# Altium schematic symbol library Capacitor - Ceramic - Sumsung.SchLib: 1421 symbols (part 2 of 8) (continued)
## CL10A225KA8NNNC (continued)
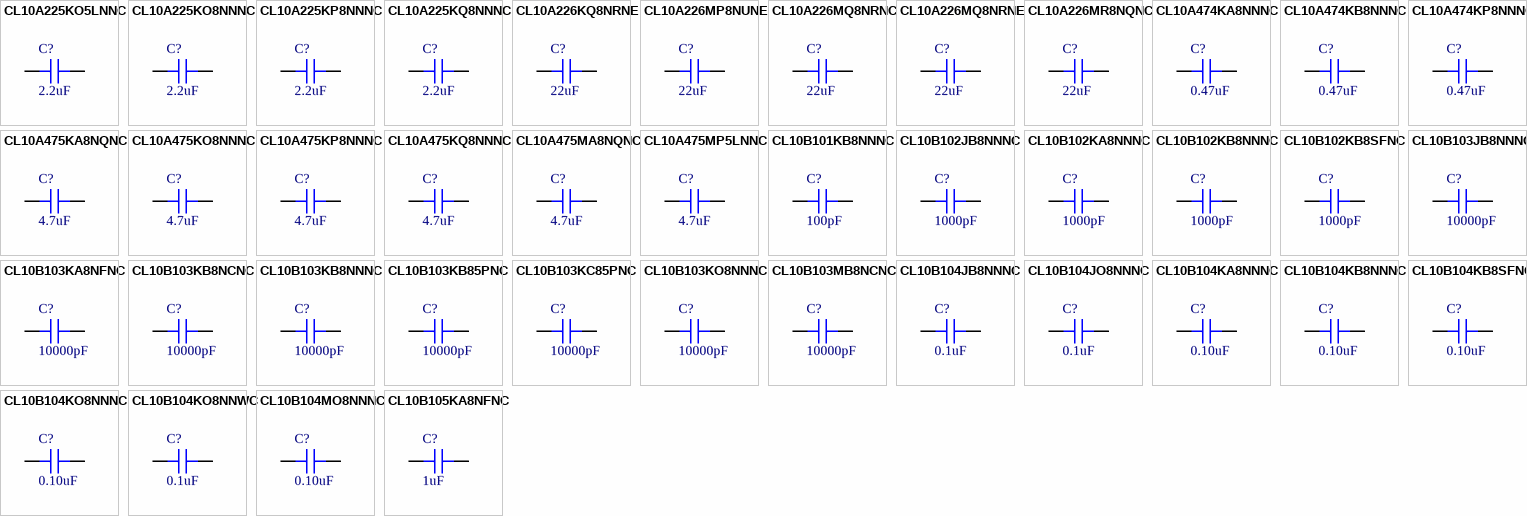
[diagram p7: symbols CL10A225KO5LNNC to CL10B105KA8NFNC]

## CL10A225KO5LNNC
designator C?, comment 2.2uF
CAP CER 2.2UF 16V X5R 0603; Part Number: CL10A225KO5LNNC; Manufacturer: Samsung Electro-Mechanics; TemperatureRange: -55C ~ 85C; Tolerance: 10%; Value: 2.2uF; PartId: 30554; Supplier 1: Digi-Key; Supplier Part Number 1: 1276-1880-2-ND; ComponentLink1Description: Datasheet; ComponentLink1URL: http://www.samsungsem.com/kr/support/product-search/mlcc/CL10A225KO5LNNC.jsp; ComponentLink2Description: Digi-Key Listing; ComponentLink2URL: https://www.digikey.com/product-detail/en/samsung-electro-mechanics/CL10A225KO5LNNC/1276-1880-2-ND/3887538; TemperatureCoefficient: X5R; Voltage: 16V; Price: 0; Device Package: 0603 (1608 Metric)
footprint CAP 0603/1608
pins: 1, 2

## CL10A225KO8NNNC
designator C?, comment 2.2uF
CAP CER 2.2UF 16V X5R 0603; Part Number: CL10A225KO8NNNC; Manufacturer: Samsung Electro-Mechanics America, Inc.; TemperatureRange: -55C ~ 85C; Tolerance: 10%; Value: 2.2uF; PartId: 13108; Supplier 1: Digi-Key; Supplier Part Number 1: 1276-1040-2-ND; ComponentLink1Description: Datasheet; ComponentLink1URL: http://www.samsungsem.com/kr/support/product-search/mlcc/CL10A225KO8NNNC.jsp; ComponentLink2Description: Digi-Key Listing; ComponentLink2URL: https://www.digikey.com/product-detail/en/samsung-electro-mechanics-america-inc/CL10A225KO8NNNC/1276-1040-2-ND/3886698; TemperatureCoefficient: X5R; Voltage: 16V; Price: 0.0236; Device Package: 0603 (1608 Metric)
footprint CAP 0603/1608
pins: 1, 2

## CL10A225KP8NNNC
designator C?, comment 2.2uF
CAP CER 2.2UF 10V X5R 0603; Part Number: CL10A225KP8NNNC; Manufacturer: Samsung Electro-Mechanics America, Inc.; TemperatureRange: -55C ~ 85C; Tolerance: 10%; Value: 2.2uF; PartId: 13147; Supplier 1: Digi-Key; Supplier Part Number 1: 1276-1085-2-ND; ComponentLink1Description: Datasheet; ComponentLink1URL: http://www.samsungsem.com/kr/support/product-search/mlcc/CL10A225KP8NNNC.jsp; ComponentLink2Description: Digi-Key Listing; ComponentLink2URL: https://www.digikey.com/product-detail/en/samsung-electro-mechanics-america-inc/CL10A225KP8NNNC/1276-1085-2-ND/3886743; TemperatureCoefficient: X5R; Voltage: 10V; Price: 0.0184; Device Package: 0603 (1608 Metric)
footprint CAP 0603/1608
pins: 1, 2

## CL10A225KQ8NNNC
designator C?, comment 2.2uF
CAP CER 2.2UF 6.3V X5R 0603; Part Number: CL10A225KQ8NNNC; Manufacturer: Samsung Electro-Mechanics America, Inc.; TemperatureRange: -55C ~ 85C; Tolerance: 10%; Value: 2.2uF; PartId: 13344; Supplier 1: Digi-Key; Supplier Part Number 1: 1276-1183-2-ND; ComponentLink1Description: Datasheet; ComponentLink1URL: http://www.samsungsem.com/kr/support/product-search/mlcc/CL10A225KQ8NNNC.jsp; ComponentLink2Description: Digi-Key Listing; ComponentLink2URL: https://www.digikey.com/product-detail/en/samsung-electro-mechanics-america-inc/CL10A225KQ8NNNC/1276-1183-2-ND/3886841; TemperatureCoefficient: X5R; Voltage: 6.3V; Price: 0.0166; Device Package: 0603 (1608 Metric)
footprint CAP 0603/1608
pins: 1, 2

## CL10A226KQ8NRNE
designator C?, comment 22uF
CAP CER 22UF 6.3V X5R 0603; Part Number: CL10A226KQ8NRNE; Manufacturer: Samsung Electro-Mechanics America, Inc.; TemperatureRange: -55C ~ 85C; Tolerance: 10%; Value: 22uF; PartId: 13568; Supplier 1: Digi-Key; Supplier Part Number 1: 1276-2867-2-ND; ComponentLink1Description: Datasheet; ComponentLink1URL: //media.digikey.com/pdf/Data%20Sheets/Samsung%20PDFs/CL10A226KQ8NRNE_Spec.pdf; ComponentLink2Description: Digi-Key Listing; ComponentLink2URL: https://www.digikey.com/product-detail/en/samsung-electro-mechanics-america-inc/CL10A226KQ8NRNE/1276-2867-2-ND/3888525; TemperatureCoefficient: X5R; Voltage: 6.3V; Price: 0.0741; Device Package: 0603 (1608 Metric)
footprint CAP 0603/1608
pins: 1, 2

## CL10A226MP8NUNE
designator C?, comment 22uF
CAP CER 22UF 10V X5R 0603; Part Number: CL10A226MP8NUNE; Manufacturer: Samsung Electro-Mechanics America, Inc.; TemperatureRange: -55C ~ 85C; Tolerance: 20%; Value: 22uF; PartId: 13111; Supplier 1: Digi-Key; Supplier Part Number 1: 1276-1274-2-ND; ComponentLink1Description: Datasheet; ComponentLink1URL: http://www.samsungsem.com/kr/support/product-search/mlcc/CL10A226MP8NUNE.jsp; ComponentLink2Description: Digi-Key Listing; ComponentLink2URL: https://www.digikey.com/product-detail/en/samsung-electro-mechanics-america-inc/CL10A226MP8NUNE/1276-1274-2-ND/3886932; TemperatureCoefficient: X5R; Voltage: 10V; Price: 0.112; Device Package: 0603 (1608 Metric)
footprint CAP 0603/1608
pins: 1, 2

## CL10A226MQ8NRNC
designator C?, comment 22uF
CAP CER 22UF 6.3V X5R 0603; Part Number: CL10A226MQ8NRNC; Manufacturer: Samsung Electro-Mechanics America, Inc.; TemperatureRange: -55C ~ 85C; Tolerance: 20%; Value: 22uF; PartId: 13020; Supplier 1: Digi-Key; Supplier Part Number 1: 1276-1193-2-ND; ComponentLink1Description: Datasheet; ComponentLink1URL: http://www.samsungsem.com/kr/support/product-search/mlcc/CL10A226MQ8NRNC.jsp; ComponentLink2Description: Digi-Key Listing; ComponentLink2URL: https://www.digikey.com/product-detail/en/samsung-electro-mechanics-america-inc/CL10A226MQ8NRNC/1276-1193-2-ND/3886851; TemperatureCoefficient: X5R; Voltage: 6.3V; Price: 0.0473; Device Package: 0603 (1608 Metric)
footprint CAP 0603/1608
pins: 1, 2

## CL10A226MQ8NRNE
designator C?, comment 22uF
CAP CER 22UF 6.3V X5R 0603; Part Number: CL10A226MQ8NRNE; Manufacturer: Samsung Electro-Mechanics America, Inc.; TemperatureRange: -55C ~ 85C; Tolerance: 20%; Value: 22uF; PartId: 13063; Supplier 1: Digi-Key; Supplier Part Number 1: 1276-2868-2-ND; ComponentLink1Description: Datasheet; ComponentLink1URL: http://www.samsungsem.com/kr/support/product-search/mlcc/CL10A226MQ8NRNE.jsp; ComponentLink2Description: Digi-Key Listing; ComponentLink2URL: https://www.digikey.com/product-detail/en/samsung-electro-mechanics-america-inc/CL10A226MQ8NRNE/1276-2868-2-ND/3888526; TemperatureCoefficient: X5R; Voltage: 6.3V; Price: 0.0512; Device Package: 0603 (1608 Metric)
footprint CAP 0603/1608
pins: 1, 2

## CL10A226MR8NQNC
designator C?, comment 22uF
CAP CER 22UF 4V X5R 0603; Part Number: CL10A226MR8NQNC; Manufacturer: Samsung Electro-Mechanics America, Inc.; TemperatureRange: -55C ~ 85C; Tolerance: 20%; Value: 22uF; PartId: 13385; Supplier 1: Digi-Key; Supplier Part Number 1: 1276-1891-2-ND; ComponentLink1Description: Datasheet; ComponentLink1URL: //media.digikey.com/pdf/Data%20Sheets/Samsung%20PDFs/CL10A226MR8NQNC_spec.pdf; ComponentLink2Description: Digi-Key Listing; ComponentLink2URL: https://www.digikey.com/product-detail/en/samsung-electro-mechanics-america-inc/CL10A226MR8NQNC/1276-1891-2-ND/3887549; TemperatureCoefficient: X5R; Voltage: 4V; Price: 0.0647; Device Package: 0603 (1608 Metric)
footprint CAP 0603/1608
pins: 1, 2

## CL10A474KA8NNNC
designator C?, comment 0.47uF
CAP CER 0.47UF 25V X5R 0603; Part Number: CL10A474KA8NNNC; Manufacturer: Samsung Electro-Mechanics; TemperatureRange: -55C ~ 85C; Tolerance: 10%; Value: 0.47uF; PartId: 30457; Supplier 1: Digi-Key; Supplier Part Number 1: 1276-1895-2-ND; ComponentLink1Description: Datasheet; ComponentLink1URL: http://www.samsungsem.com/kr/support/product-search/mlcc/CL10A474KA8NNNC.jsp; ComponentLink2Description: Digi-Key Listing; ComponentLink2URL: https://www.digikey.com/product-detail/en/samsung-electro-mechanics/CL10A474KA8NNNC/1276-1895-2-ND/3887553; TemperatureCoefficient: X5R; Voltage: 25V; Price: 0; Device Package: 0603 (1608 Metric)
footprint CAP 0603/1608
pins: 1, 2

## CL10A474KB8NNNC
designator C?, comment 0.47uF
CAP CER 0.47UF 50V X5R 0603; Part Number: CL10A474KB8NNNC; Manufacturer: Samsung Electro-Mechanics America, Inc.; TemperatureRange: -55C ~ 85C; Tolerance: 10%; Value: 0.47uF; PartId: 13543; Supplier 1: Digi-Key; Supplier Part Number 1: 1276-1896-2-ND; ComponentLink1Description: Datasheet; ComponentLink1URL: http://www.samsungsem.com/kr/support/product-search/mlcc/CL10A474KB8NNNC.jsp; ComponentLink2Description: Digi-Key Listing; ComponentLink2URL: https://www.digikey.com/product-detail/en/samsung-electro-mechanics-america-inc/CL10A474KB8NNNC/1276-1896-2-ND/3887554; TemperatureCoefficient: X5R; Voltage: 50V; Price: 0.0281; Device Package: 0603 (1608 Metric)
footprint CAP 0603/1608
pins: 1, 2

## CL10A474KP8NNNC
designator C?, comment 0.47uF
CAP CER 0.47UF 10V X5R 0603; Part Number: CL10A474KP8NNNC; Manufacturer: Samsung Electro-Mechanics; TemperatureRange: -55C ~ 85C; Tolerance: 10%; Value: 0.47uF; PartId: 30344; Supplier 1: Digi-Key; Supplier Part Number 1: 1276-1898-2-ND; ComponentLink1Description: Datasheet; ComponentLink1URL: http://www.samsungsem.com/kr/support/product-search/mlcc/CL10A474KP8NNNC.jsp; ComponentLink2Description: Digi-Key Listing; ComponentLink2URL: https://www.digikey.com/product-detail/en/samsung-electro-mechanics/CL10A474KP8NNNC/1276-1898-2-ND/3887556; TemperatureCoefficient: X5R; Voltage: 10V; Price: 0; Device Package: 0603 (1608 Metric)
footprint CAP 0603/1608
pins: 1, 2

## CL10A475KA8NQNC
designator C?, comment 4.7uF
CAP CER 4.7UF 25V X5R 0603; Part Number: CL10A475KA8NQNC; Manufacturer: Samsung Electro-Mechanics America, Inc.; TemperatureRange: -55C ~ 85C; Tolerance: 10%; Value: 4.7uF; PartId: 13123; Supplier 1: Digi-Key; Supplier Part Number 1: 1276-1900-2-ND; ComponentLink1Description: Datasheet; ComponentLink1URL: http://www.samsungsem.com/kr/support/product-search/mlcc/CL10A475KA8NQNC.jsp; ComponentLink2Description: Digi-Key Listing; ComponentLink2URL: https://www.digikey.com/product-detail/en/samsung-electro-mechanics-america-inc/CL10A475KA8NQNC/1276-1900-2-ND/3887558; TemperatureCoefficient: X5R; Voltage: 25V; Price: 0.0763; Device Package: 0603 (1608 Metric)
footprint CAP 0603/1608
pins: 1, 2

## CL10A475KO8NNNC
designator C?, comment 4.7uF
CAP CER 4.7UF 16V X5R 0603; Part Number: CL10A475KO8NNNC; Manufacturer: Samsung Electro-Mechanics America, Inc.; TemperatureRange: -55C ~ 85C; Tolerance: 10%; Value: 4.7uF; PartId: 13180; Supplier 1: Digi-Key; Supplier Part Number 1: 1276-1784-2-ND; ComponentLink1Description: Datasheet; ComponentLink1URL: http://www.samsungsem.com/kr/support/product-search/mlcc/CL10A475KO8NNNC.jsp; ComponentLink2Description: Digi-Key Listing; ComponentLink2URL: https://www.digikey.com/product-detail/en/samsung-electro-mechanics-america-inc/CL10A475KO8NNNC/1276-1784-2-ND/3887442; TemperatureCoefficient: X5R; Voltage: 16V; Price: 0.0499; Device Package: 0603 (1608 Metric)
footprint CAP 0603/1608
pins: 1, 2

## CL10A475KP8NNNC
designator C?, comment 4.7uF
CAP CER 4.7UF 10V X5R 0603; Part Number: CL10A475KP8NNNC; Manufacturer: Samsung Electro-Mechanics America, Inc.; TemperatureRange: -55C ~ 85C; Tolerance: 10%; Value: 4.7uF; PartId: 13341; Supplier 1: Digi-Key; Supplier Part Number 1: 1276-1044-2-ND; ComponentLink1Description: Datasheet; ComponentLink1URL: http://www.samsungsem.com/kr/support/product-search/mlcc/CL10A475KP8NNNC.jsp; ComponentLink2Description: Digi-Key Listing; ComponentLink2URL: https://www.digikey.com/product-detail/en/samsung-electro-mechanics-america-inc/CL10A475KP8NNNC/1276-1044-2-ND/3886702; TemperatureCoefficient: X5R; Voltage: 10V; Price: 0.0205; Device Package: 0603 (1608 Metric)
footprint CAP 0603/1608
pins: 1, 2

## CL10A475KQ8NNNC
designator C?, comment 4.7uF
CAP CER 4.7UF 6.3V X5R 0603; Part Number: CL10A475KQ8NNNC; Manufacturer: Samsung Electro-Mechanics America, Inc.; TemperatureRange: -55C ~ 85C; Tolerance: 10%; Value: 4.7uF; PartId: 13295; Supplier 1: Digi-Key; Supplier Part Number 1: 1276-1045-2-ND; ComponentLink1Description: Datasheet; ComponentLink1URL: http://www.samsungsem.com/kr/support/product-search/mlcc/CL10A475KQ8NNNC.jsp; ComponentLink2Description: Digi-Key Listing; ComponentLink2URL: https://www.digikey.com/product-detail/en/samsung-electro-mechanics-america-inc/CL10A475KQ8NNNC/1276-1045-2-ND/3886703; TemperatureCoefficient: X5R; Voltage: 6.3V; Price: 0.0144; Device Package: 0603 (1608 Metric)
footprint CAP 0603/1608
pins: 1, 2

## CL10A475MA8NQNC
designator C?, comment 4.7uF
CAP CER 4.7UF 25V X5R 0603; Part Number: CL10A475MA8NQNC; Manufacturer: Samsung Electro-Mechanics America, Inc.; TemperatureRange: -55C ~ 85C; Tolerance: 20%; Value: 4.7uF; PartId: 13584; Supplier 1: Digi-Key; Supplier Part Number 1: 1276-1903-2-ND; ComponentLink1Description: Datasheet; ComponentLink1URL: http://www.samsungsem.com/kr/front/downloadcms.do?path=/kr/support/product-search/mlcc/__icsFiles/afieldfile/2014/11/05&fileName=C_CL10A475MA8NQNC.pdf; ComponentLink2Description: Digi-Key Listing; ComponentLink2URL: https://www.digikey.com/product-detail/en/samsung-electro-mechanics-america-inc/CL10A475MA8NQNC/1276-1903-2-ND/3887561; TemperatureCoefficient: X5R; Voltage: 25V; Price: 0.0763; Device Package: 0603 (1608 Metric)
footprint CAP 0603/1608
pins: 1, 2

## CL10A475MP5LNNC
designator C?, comment 4.7uF
CAP CER 4.7UF 10V X5R 0603; Part Number: CL10A475MP5LNNC; Manufacturer: Samsung Electro-Mechanics; TemperatureRange: -55C ~ 85C; Tolerance: 20%; Value: 4.7uF; PartId: 30543; Supplier 1: Digi-Key; Supplier Part Number 1: 1276-6684-2-ND; ComponentLink1Description: Datasheet; ComponentLink1URL: http://www.samsungsem.com/kr/support/product-search/mlcc/CL10A475MP5LNNC.jsp; ComponentLink2Description: Digi-Key Listing; ComponentLink2URL: https://www.digikey.com/product-detail/en/samsung-electro-mechanics/CL10A475MP5LNNC/1276-6684-2-ND/5961168; TemperatureCoefficient: X5R; Voltage: 10V; Price: 0; Device Package: 0603 (1608 Metric)
footprint CAP 0603/1608
pins: 1, 2

## CL10B101KB8NNNC
designator C?, comment 100pF
CAP CER 100PF 50V X7R 0603; Part Number: CL10B101KB8NNNC; Manufacturer: Samsung Electro-Mechanics America, Inc.; TemperatureRange: -55C ~ 125C; Tolerance: 10%; Value: 100pF; PartId: 5325; Supplier 1: Digi-Key; Supplier Part Number 1: 1276-1909-2-ND; ComponentLink1Description: Datasheet; ComponentLink1URL: http://www.samsungsem.com/kr/support/product-search/mlcc/CL10B101KB8NNNC.jsp; ComponentLink2Description: Digi-Key listing; ComponentLink2URL: http://digikey.com/product-detail/en/CL10B101KB8NNNC/1276-1909-2-ND/3887567; TemperatureCoefficient: X7R; Voltage: 50V; Price: 0.0086; Type: -; Device Package: 0603 (1608 Metric)
footprint CAP 0603/1608
pins: 1, 2

## CL10B102JB8NNNC
designator C?, comment 1000pF
CAP CER 1000PF 50V X7R 0603; Part Number: CL10B102JB8NNNC; Manufacturer: Samsung Electro-Mechanics America, Inc.; TemperatureRange: -55C ~ 125C; Tolerance: 5%; Value: 1000pF; PartId: 5384; Supplier 1: Digi-Key; Supplier Part Number 1: 1276-1194-2-ND; ComponentLink1Description: Datasheet; ComponentLink1URL: http://www.samsungsem.com/kr/support/product-search/mlcc/CL10B102JB8NNNC.jsp; ComponentLink2Description: Digi-Key listing; ComponentLink2URL: http://digikey.com/product-detail/en/CL10B102JB8NNNC/1276-1194-2-ND/3886852; TemperatureCoefficient: X7R; Voltage: 50V; Price: 0.0106; Type: -; Device Package: 0603 (1608 Metric)
footprint CAP 0603/1608
pins: 1, 2

## CL10B102KA8NNNC
designator C?, comment 1000pF
CAP CER 1000PF 25V X7R 0603; Part Number: CL10B102KA8NNNC; Manufacturer: Samsung Electro-Mechanics America, Inc.; TemperatureRange: -55C ~ 125C; Tolerance: 10%; Value: 1000pF; PartId: 5270; Supplier 1: Digi-Key; Supplier Part Number 1: 1276-1195-2-ND; ComponentLink1Description: Datasheet; ComponentLink1URL: http://www.samsungsem.com/kr/support/product-search/mlcc/CL10B102KA8NNNC.jsp; ComponentLink2Description: Digi-Key listing; ComponentLink2URL: http://digikey.com/product-detail/en/CL10B102KA8NNNC/1276-1195-2-ND/3886853; TemperatureCoefficient: X7R; Voltage: 25V; Price: 0.0046; Type: -; Device Package: 0603 (1608 Metric)
footprint CAP 0603/1608
pins: 1, 2

## CL10B102KB8NNNC
designator C?, comment 1000pF
CAP CER 1000PF 50V X7R 0603; Part Number: CL10B102KB8NNNC; Manufacturer: Samsung Electro-Mechanics America, Inc.; TemperatureRange: -55C ~ 125C; Tolerance: 10%; Value: 1000pF; PartId: 5269; Supplier 1: Digi-Key; Supplier Part Number 1: 1276-1018-2-ND; ComponentLink1Description: Datasheet; ComponentLink1URL: http://www.samsungsem.com/kr/support/product-search/mlcc/CL10B102KB8NNNC.jsp; ComponentLink2Description: Digi-Key listing; ComponentLink2URL: http://digikey.com/product-detail/en/CL10B102KB8NNNC/1276-1018-2-ND/3886676; TemperatureCoefficient: X7R; Voltage: 50V; Price: 0.0046; Type: -; Device Package: 0603 (1608 Metric)
footprint CAP 0603/1608
pins: 1, 2

## CL10B102KB8SFNC
designator C?, comment 1000pF
CAP CER 1000PF 50V X7R 0603; Part Number: CL10B102KB8SFNC; Manufacturer: Samsung Electro-Mechanics America, Inc.; TemperatureRange: -55C ~ 125C; Tolerance: 10%; Value: 1000pF; PartId: 13009; Supplier 1: Digi-Key; Supplier Part Number 1: 1276-1916-2-ND; ComponentLink1Description: Datasheet; ComponentLink1URL: http://www.samsungsem.com/kr/support/product-search/mlcc/CL10B102KB8SFNC.jsp; ComponentLink2Description: Digi-Key Listing; ComponentLink2URL: https://www.digikey.com/product-detail/en/samsung-electro-mechanics-america-inc/CL10B102KB8SFNC/1276-1916-2-ND/3887574; TemperatureCoefficient: X7R; Voltage: 50V; Price: 0.0032; Device Package: 0603 (1608 Metric)
footprint CAP 0603/1608
pins: 1, 2

## CL10B103JB8NNNC
designator C?, comment 10000pF
CAP CER 10000PF 50V X7R 0603; Part Number: CL10B103JB8NNNC; Manufacturer: Samsung Electro-Mechanics America, Inc.; TemperatureRange: -55C ~ 125C; Tolerance: 5%; Value: 10000pF; PartId: 13288; Supplier 1: Digi-Key; Supplier Part Number 1: 1276-1103-2-ND; ComponentLink1Description: Datasheet; ComponentLink1URL: http://www.samsungsem.com/kr/support/product-search/mlcc/CL10B103JB8NNNC.jsp; ComponentLink2Description: Digi-Key Listing; ComponentLink2URL: https://www.digikey.com/product-detail/en/samsung-electro-mechanics-america-inc/CL10B103JB8NNNC/1276-1103-2-ND/3886761; TemperatureCoefficient: X7R; Voltage: 50V; Price: 0.0069; Device Package: 0603 (1608 Metric)
footprint CAP 0603/1608
pins: 1, 2

## CL10B103KA8NFNC
designator C?, comment 10000pF
CAP CER 10000PF 25V X7R 0603; Part Number: CL10B103KA8NFNC; Manufacturer: Samsung Electro-Mechanics; TemperatureRange: -55C ~ 125C; Tolerance: 10%; Value: 10000pF; PartId: 30233; Supplier 1: Digi-Key; Supplier Part Number 1: 1276-1919-2-ND; ComponentLink1Description: Datasheet; ComponentLink1URL: http://www.samsungsem.com/kr/support/product-search/mlcc/CL10B103KA8NFNC.jsp; ComponentLink2Description: Digi-Key Listing; ComponentLink2URL: https://www.digikey.com/product-detail/en/samsung-electro-mechanics/CL10B103KA8NFNC/1276-1919-2-ND/3887577; TemperatureCoefficient: X7R; Voltage: 25V; Price: 0; Device Package: 0603 (1608 Metric)
footprint CAP 0603/1608
pins: 1, 2

## CL10B103KB8NCNC
designator C?, comment 10000pF
CAP CER 10000PF 50V X7R 0603; Part Number: CL10B103KB8NCNC; Manufacturer: Samsung Electro-Mechanics America, Inc.; TemperatureRange: -55C ~ 125C; Tolerance: 10%; Value: 10000pF; PartId: 13008; Supplier 1: Digi-Key; Supplier Part Number 1: 1276-1921-2-ND; ComponentLink1Description: Datasheet; ComponentLink1URL: http://www.samsungsem.com/kr/support/library/product-catalog/__icsFiles/afieldfile/2015/11/18/MLCC.pdf; ComponentLink2Description: Digi-Key Listing; ComponentLink2URL: https://www.digikey.com/product-detail/en/samsung-electro-mechanics-america-inc/CL10B103KB8NCNC/1276-1921-2-ND/3887579; TemperatureCoefficient: X7R; Voltage: 50V; Price: 0.0032; Device Package: 0603 (1608 Metric)
footprint CAP 0603/1608
pins: 1, 2

## CL10B103KB8NNNC
designator C?, comment 10000pF
CAP CER 10000PF 50V X7R 0603; Part Number: CL10B103KB8NNNC; Manufacturer: Samsung Electro-Mechanics America, Inc.; TemperatureRange: -55C ~ 125C; Tolerance: 10%; Value: 10000pF; PartId: 13141; Supplier 1: Digi-Key; Supplier Part Number 1: 1276-1009-2-ND; ComponentLink1Description: Datasheet; ComponentLink1URL: http://www.samsungsem.com/kr/support/product-search/mlcc/CL10B103KB8NNNC.jsp; ComponentLink2Description: Digi-Key Listing; ComponentLink2URL: https://www.digikey.com/product-detail/en/samsung-electro-mechanics-america-inc/CL10B103KB8NNNC/1276-1009-2-ND/3886667; TemperatureCoefficient: X7R; Voltage: 50V; Price: 0.0032; Device Package: 0603 (1608 Metric)
footprint CAP 0603/1608
pins: 1, 2

## CL10B103KB85PNC
designator C?, comment 10000pF
CAP CER 10000PF 50V X7R 0603; Part Number: CL10B103KB85PNC; Manufacturer: Samsung Electro-Mechanics America, Inc.; TemperatureRange: -55C ~ 125C; Tolerance: 10%; Value: 10000pF; PartId: 13570; Supplier 1: Digi-Key; Supplier Part Number 1: 1276-1920-2-ND; ComponentLink1Description: Datasheet; ComponentLink1URL: http://www.samsungsem.com/kr/support/library/product-catalog/__icsFiles/afieldfile/2015/11/18/MLCC.pdf; ComponentLink2Description: Digi-Key Listing; ComponentLink2URL: https://www.digikey.com/product-detail/en/samsung-electro-mechanics-america-inc/CL10B103KB85PNC/1276-1920-2-ND/3887578; TemperatureCoefficient: X7R; Voltage: 50V; Price: 0.0069; Device Package: 0603 (1608 Metric)
footprint CAP 0603/1608
pins: 1, 2

## CL10B103KC85PNC
designator C?, comment 10000pF
CAP CER 10000PF 100V X7R 0603; Part Number: CL10B103KC85PNC; Manufacturer: Samsung Electro-Mechanics America, Inc.; TemperatureRange: -55C ~ 125C; Tolerance: 10%; Value: 10000pF; PartId: 13529; Supplier 1: Digi-Key; Supplier Part Number 1: 1276-1925-2-ND; ComponentLink1Description: Datasheet; ComponentLink1URL: http://www.samsungsem.com/kr/support/library/product-catalog/__icsFiles/afieldfile/2015/11/18/MLCC.pdf; ComponentLink2Description: Digi-Key Listing; ComponentLink2URL: https://www.digikey.com/product-detail/en/samsung-electro-mechanics-america-inc/CL10B103KC85PNC/1276-1925-2-ND/3887583; TemperatureCoefficient: X7R; Voltage: 100V; Price: 0.0085; Device Package: 0603 (1608 Metric)
footprint CAP 0603/1608
pins: 1, 2

## CL10B103KO8NNNC
designator C?, comment 10000pF
CAP CER 10000PF 16V X7R 0603; Part Number: CL10B103KO8NNNC; Manufacturer: Samsung Electro-Mechanics America, Inc.; TemperatureRange: -55C ~ 125C; Tolerance: 10%; Value: 10000pF; PartId: 5271; Supplier 1: Digi-Key; Supplier Part Number 1: 1276-1926-2-ND; ComponentLink1Description: Datasheet; ComponentLink1URL: http://www.samsungsem.com/kr/support/product-search/mlcc/CL10B103KO8NNNC.jsp; ComponentLink2Description: Digi-Key listing; ComponentLink2URL: http://digikey.com/product-detail/en/CL10B103KO8NNNC/1276-1926-2-ND/3887584; TemperatureCoefficient: X7R; Voltage: 16V; Price: 0.0047; Type: -; Device Package: 0603 (1608 Metric)
footprint CAP 0603/1608
pins: 1, 2

## CL10B103MB8NCNC
designator C?, comment 10000pF
CAP CER 10000PF 50V X7R 0603; Part Number: CL10B103MB8NCNC; Manufacturer: Samsung Electro-Mechanics America, Inc.; TemperatureRange: -55C ~ 125C; Tolerance: 20%; Value: 10000pF; PartId: 13153; Supplier 1: Digi-Key; Supplier Part Number 1: 1276-1927-2-ND; ComponentLink1Description: Datasheet; ComponentLink1URL: http://www.samsungsem.com/kr/support/library/product-catalog/__icsFiles/afieldfile/2015/11/18/MLCC.pdf; ComponentLink2Description: Digi-Key Listing; ComponentLink2URL: https://www.digikey.com/product-detail/en/samsung-electro-mechanics-america-inc/CL10B103MB8NCNC/1276-1927-2-ND/3887585; TemperatureCoefficient: X7R; Voltage: 50V; Price: 0.0032; Device Package: 0603 (1608 Metric)
footprint CAP 0603/1608
pins: 1, 2

## CL10B104JB8NNNC
designator C?, comment 0.1uF
CAP CER 0.1UF 50V X7R 0603; Part Number: CL10B104JB8NNNC; Manufacturer: Samsung Electro-Mechanics America, Inc.; TemperatureRange: -55C ~ 125C; Tolerance: 5%; Value: 0.1uF; PartId: 5416; Supplier 1: Digi-Key; Supplier Part Number 1: 1276-1033-2-ND; ComponentLink1Description: Datasheet; ComponentLink1URL: http://www.samsungsem.com/kr/support/product-search/mlcc/CL10B104JB8NNNC.jsp; ComponentLink2Description: Digi-Key listing; ComponentLink2URL: http://digikey.com/product-detail/en/CL10B104JB8NNNC/1276-1033-2-ND/3886691; TemperatureCoefficient: X7R; Voltage: 50V; Price: 0.0132; Type: -; Device Package: 0603 (1608 Metric)
footprint CAP 0603/1608
pins: 1, 2

## CL10B104JO8NNNC
designator C?, comment 0.1uF
CAP CER 0.1UF 16V X7R 0603; Part Number: CL10B104JO8NNNC; Manufacturer: Samsung Electro-Mechanics America, Inc.; TemperatureRange: -55C ~ 125C; Tolerance: 5%; Value: 0.1uF; PartId: 5417; Supplier 1: Digi-Key; Supplier Part Number 1: 1276-1061-2-ND; ComponentLink1Description: Datasheet; ComponentLink1URL: http://www.samsungsem.com/kr/support/product-search/mlcc/CL10B104JO8NNNC.jsp; ComponentLink2Description: Digi-Key listing; ComponentLink2URL: http://digikey.com/product-detail/en/CL10B104JO8NNNC/1276-1061-2-ND/3886719; TemperatureCoefficient: X7R; Voltage: 16V; Price: 0.0132; Type: -; Device Package: 0603 (1608 Metric)
footprint CAP 0603/1608
pins: 1, 2

## CL10B104KA8NNNC
designator C?, comment 0.10uF
CAP CER 0.1UF 25V X7R 0603; Part Number: CL10B104KA8NNNC; Manufacturer: Samsung Electro-Mechanics America, Inc.; TemperatureRange: -55C ~ 125C; Tolerance: 10%; Value: 0.10uF; PartId: 13014; Supplier 1: Digi-Key; Supplier Part Number 1: 1276-1006-2-ND; ComponentLink1Description: Datasheet; ComponentLink1URL: http://www.samsungsem.com/kr/support/product-search/mlcc/CL10B104KA8NNNC.jsp; ComponentLink2Description: Digi-Key Listing; ComponentLink2URL: https://www.digikey.com/product-detail/en/samsung-electro-mechanics-america-inc/CL10B104KA8NNNC/1276-1006-2-ND/3886664; TemperatureCoefficient: X7R; Voltage: 25V; Price: 0.0035; Device Package: 0603 (1608 Metric)
footprint CAP 0603/1608
pins: 1, 2

## CL10B104KB8NNNC
designator C?, comment 0.10uF
CAP CER 0.1UF 50V X7R 0603; Part Number: CL10B104KB8NNNC; Manufacturer: Samsung Electro-Mechanics America, Inc.; TemperatureRange: -55C ~ 125C; Tolerance: 10%; Value: 0.10uF; PartId: 12945; Supplier 1: Digi-Key; Supplier Part Number 1: 1276-1000-2-ND; ComponentLink1Description: Datasheet; ComponentLink1URL: http://www.samsungsem.com/kr/support/product-search/mlcc/CL10B104KB8NNNC.jsp; ComponentLink2Description: Digi-Key Listing; ComponentLink2URL: https://www.digikey.com/product-detail/en/samsung-electro-mechanics-america-inc/CL10B104KB8NNNC/1276-1000-2-ND/3886658; TemperatureCoefficient: X7R; Voltage: 50V; Price: 0.0052; Device Package: 0603 (1608 Metric)
footprint CAP 0603/1608
pins: 1, 2

## CL10B104KB8SFNC
designator C?, comment 0.10uF
CAP CER 0.1UF 50V X7R 0603; Part Number: CL10B104KB8SFNC; Manufacturer: Samsung Electro-Mechanics America, Inc.; TemperatureRange: -55C ~ 125C; Tolerance: 10%; Value: 0.10uF; PartId: 12960; Supplier 1: Digi-Key; Supplier Part Number 1: 1276-1936-2-ND; ComponentLink1Description: Datasheet; ComponentLink1URL: http://www.samsungsem.com/kr/support/product-search/mlcc/CL10B104KB8SFNC.jsp; ComponentLink2Description: Digi-Key Listing; ComponentLink2URL: https://www.digikey.com/product-detail/en/samsung-electro-mechanics-america-inc/CL10B104KB8SFNC/1276-1936-2-ND/3887594; TemperatureCoefficient: X7R; Voltage: 50V; Price: 0.0052; Device Package: 0603 (1608 Metric)
footprint CAP 0603/1608
pins: 1, 2

## CL10B104KO8NNNC
designator C?, comment 0.10uF
CAP CER 0.1UF 16V X7R 0603; Part Number: CL10B104KO8NNNC; Manufacturer: Samsung Electro-Mechanics America, Inc.; TemperatureRange: -55C ~ 125C; Tolerance: 10%; Value: 0.10uF; PartId: 13005; Supplier 1: Digi-Key; Supplier Part Number 1: 1276-1005-2-ND; ComponentLink1Description: Datasheet; ComponentLink1URL: http://www.samsungsem.com/kr/support/product-search/mlcc/CL10B104KO8NNNC.jsp; ComponentLink2Description: Digi-Key Listing; ComponentLink2URL: https://www.digikey.com/product-detail/en/samsung-electro-mechanics-america-inc/CL10B104KO8NNNC/1276-1005-2-ND/3886663; TemperatureCoefficient: X7R; Voltage: 16V; Price: 0.0034; Device Package: 0603 (1608 Metric)
footprint CAP 0603/1608
pins: 1, 2

## CL10B104KO8NNWC
designator C?, comment 0.1uF
CAP CER 0.1UF 16V X7R 0603; Part Number: CL10B104KO8NNWC; Manufacturer: Samsung Electro-Mechanics; TemperatureRange: -55C ~ 125C; Tolerance: 10%; Value: 0.1uF; PartId: 30201; Supplier 1: Digi-Key; Supplier Part Number 1: 1276-1939-2-ND; ComponentLink1Description: Datasheet; ComponentLink1URL: http://www.samsungsem.com/kr/support/product-search/mlcc/CL10B104KO8NNWC.jsp; ComponentLink2Description: Digi-Key Listing; ComponentLink2URL: https://www.digikey.com/product-detail/en/samsung-electro-mechanics/CL10B104KO8NNWC/1276-1939-2-ND/3887597; TemperatureCoefficient: X7R; Voltage: 16V; Price: 0; Device Package: 0603 (1608 Metric)
footprint CAP 0603/1608
pins: 1, 2

## CL10B104MO8NNNC
designator C?, comment 0.10uF
CAP CER 0.1UF 16V X7R 0603; Part Number: CL10B104MO8NNNC; Manufacturer: Samsung Electro-Mechanics America, Inc.; TemperatureRange: -55C ~ 125C; Tolerance: 20%; Value: 0.10uF; PartId: 13432; Supplier 1: Digi-Key; Supplier Part Number 1: 1276-1031-2-ND; ComponentLink1Description: Datasheet; ComponentLink1URL: http://www.samsungsem.com/kr/support/product-search/mlcc/CL10B104MO8NNNC.jsp; ComponentLink2Description: Digi-Key Listing; ComponentLink2URL: https://www.digikey.com/product-detail/en/samsung-electro-mechanics-america-inc/CL10B104MO8NNNC/1276-1031-2-ND/3886689; TemperatureCoefficient: X7R; Voltage: 16V; Price: 0.0034; Device Package: 0603 (1608 Metric)
footprint CAP 0603/1608
pins: 1, 2

## CL10B105KA8NFNC
designator C?, comment 1uF
CAP CER 1UF 25V X7R 0603; Part Number: CL10B105KA8NFNC; Manufacturer: Samsung Electro-Mechanics America, Inc.; TemperatureRange: -55C ~ 125C; Tolerance: 10%; Value: 1uF; PartId: 13195; Supplier 1: Digi-Key; Supplier Part Number 1: 1276-1942-2-ND; ComponentLink1Description: Datasheet; ComponentLink1URL: //media.digikey.com/pdf/Data%20Sheets/Samsung%20PDFs/CL10B105KA8NFNC_Spec.pdf; ComponentLink2Description: Digi-Key Listing; ComponentLink2URL: https://www.digikey.com/product-detail/en/samsung-electro-mechanics-america-inc/CL10B105KA8NFNC/1276-1942-2-ND/3887600; TemperatureCoefficient: X7R; Voltage: 25V; Price: 0.0131; Device Package: 0603 (1608 Metric)
footprint CAP 0603/1608
pins: 1, 2

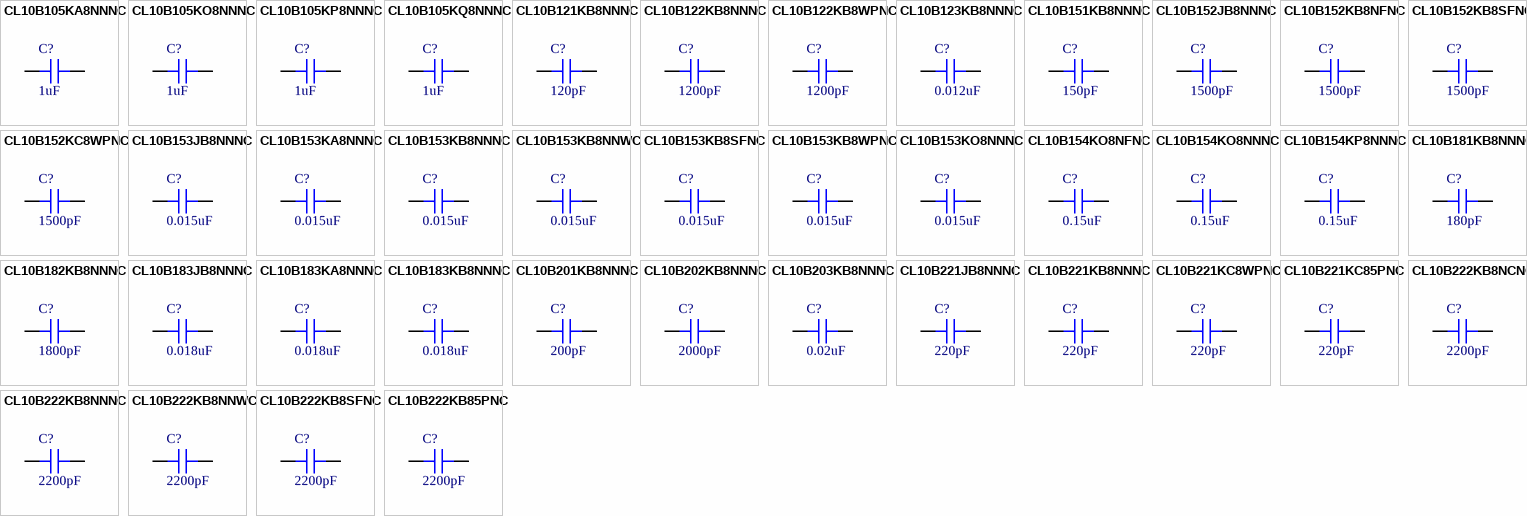
[diagram p8: symbols CL10B105KA8NNNC to CL10B222KB85PNC]

## CL10B105KA8NNNC
designator C?, comment 1uF
CAP CER 1UF 25V X7R 0603; Part Number: CL10B105KA8NNNC; Manufacturer: Samsung Electro-Mechanics America, Inc.; TemperatureRange: -55C ~ 125C; Tolerance: 10%; Value: 1uF; PartId: 12976; Supplier 1: Digi-Key; Supplier Part Number 1: 1276-1184-2-ND; ComponentLink1Description: Datasheet; ComponentLink1URL: //media.digikey.com/pdf/Data%20Sheets/Samsung%20PDFs/CL10B105KA8NNNC_spec.pdf; ComponentLink2Description: Digi-Key Listing; ComponentLink2URL: https://www.digikey.com/product-detail/en/samsung-electro-mechanics-america-inc/CL10B105KA8NNNC/1276-1184-2-ND/3886842; TemperatureCoefficient: X7R; Voltage: 25V; Price: 0.0131; Device Package: 0603 (1608 Metric)
footprint CAP 0603/1608
pins: 1, 2

## CL10B105KO8NNNC
designator C?, comment 1uF
CAP CER 1UF 16V X7R 0603; Part Number: CL10B105KO8NNNC; Manufacturer: Samsung Electro-Mechanics America, Inc.; TemperatureRange: -55C ~ 125C; Tolerance: 10%; Value: 1uF; PartId: 13124; Supplier 1: Digi-Key; Supplier Part Number 1: 1276-1019-2-ND; ComponentLink1Description: Datasheet; ComponentLink1URL: http://www.samsungsem.com/kr/support/product-search/mlcc/CL10B105KO8NNNC.jsp; ComponentLink2Description: Digi-Key Listing; ComponentLink2URL: https://www.digikey.com/product-detail/en/samsung-electro-mechanics-america-inc/CL10B105KO8NNNC/1276-1019-2-ND/3886677; TemperatureCoefficient: X7R; Voltage: 16V; Price: 0.0085; Device Package: 0603 (1608 Metric)
footprint CAP 0603/1608
pins: 1, 2

## CL10B105KP8NNNC
designator C?, comment 1uF
CAP CER 1UF 10V X7R 0603; Part Number: CL10B105KP8NNNC; Manufacturer: Samsung Electro-Mechanics America, Inc.; TemperatureRange: -55C ~ 125C; Tolerance: 10%; Value: 1uF; PartId: 13241; Supplier 1: Digi-Key; Supplier Part Number 1: 1276-1946-2-ND; ComponentLink1Description: Datasheet; ComponentLink1URL: http://www.samsungsem.com/kr/support/product-search/mlcc/CL10B105KP8NNNC.jsp; ComponentLink2Description: Digi-Key Listing; ComponentLink2URL: https://www.digikey.com/product-detail/en/samsung-electro-mechanics-america-inc/CL10B105KP8NNNC/1276-1946-2-ND/3887604; TemperatureCoefficient: X7R; Voltage: 10V; Price: 0.0078; Device Package: 0603 (1608 Metric)
footprint CAP 0603/1608
pins: 1, 2

## CL10B105KQ8NNNC
designator C?, comment 1uF
CAP CER 1UF 6.3V X7R 0603; Part Number: CL10B105KQ8NNNC; Manufacturer: Samsung Electro-Mechanics America, Inc.; TemperatureRange: -55C ~ 125C; Tolerance: 10%; Value: 1uF; PartId: 5397; Supplier 1: Digi-Key; Supplier Part Number 1: 1276-1024-2-ND; ComponentLink1Description: Datasheet; ComponentLink1URL: http://www.samsungsem.com/kr/support/product-search/mlcc/CL10B105KQ8NNNC.jsp; ComponentLink2Description: Digi-Key listing; ComponentLink2URL: http://digikey.com/product-detail/en/CL10B105KQ8NNNC/1276-1024-2-ND/3886682; TemperatureCoefficient: X7R; Voltage: 6.3V; Price: 0.0112; Type: -; Device Package: 0603 (1608 Metric)
footprint CAP 0603/1608
pins: 1, 2

## CL10B121KB8NNNC
designator C?, comment 120pF
CAP CER 120PF 50V X7R 0603; Part Number: CL10B121KB8NNNC; Manufacturer: Samsung Electro-Mechanics America, Inc.; TemperatureRange: -55C ~ 125C; Tolerance: 10%; Value: 120pF; PartId: 5244; Supplier 1: Digi-Key; Supplier Part Number 1: 1276-1949-2-ND; ComponentLink1Description: Datasheet; ComponentLink1URL: http://www.samsungsem.com/kr/support/product-search/mlcc/CL10B121KB8NNNC.jsp; ComponentLink2Description: Digi-Key listing; ComponentLink2URL: http://digikey.com/product-detail/en/CL10B121KB8NNNC/1276-1949-2-ND/3887607; TemperatureCoefficient: X7R; Voltage: 50V; Price: 0.0032; Type: -; Device Package: 0603 (1608 Metric)
footprint CAP 0603/1608
pins: 1, 2

## CL10B122KB8NNNC
designator C?, comment 1200pF
CAP CER 1200PF 50V X7R 0603; Part Number: CL10B122KB8NNNC; Manufacturer: Samsung Electro-Mechanics America, Inc.; TemperatureRange: -55C ~ 125C; Tolerance: 10%; Value: 1200pF; PartId: 5350; Supplier 1: Digi-Key; Supplier Part Number 1: 1276-1951-2-ND; ComponentLink1Description: Datasheet; ComponentLink1URL: http://www.samsungsem.com/kr/support/product-search/mlcc/CL10B122KB8NNNC.jsp; ComponentLink2Description: Digi-Key listing; ComponentLink2URL: http://digikey.com/product-detail/en/CL10B122KB8NNNC/1276-1951-2-ND/3887609; TemperatureCoefficient: X7R; Voltage: 50V; Price: 0.0097; Type: -; Device Package: 0603 (1608 Metric)
footprint CAP 0603/1608
pins: 1, 2

## CL10B122KB8WPNC
designator C?, comment 1200pF
CAP CER 1200PF 50V X7R 0603; Part Number: CL10B122KB8WPNC; Manufacturer: Samsung Electro-Mechanics; TemperatureRange: -55C ~ 125C; Tolerance: 10%; Value: 1200pF; PartId: 30772; Supplier 1: Digi-Key; Supplier Part Number 1: 1276-6602-2-ND; ComponentLink1Description: Datasheet; ComponentLink1URL: http://www.samsungsem.com/kr/support/product-search/mlcc/CL10B122KB8WPNC.jsp; ComponentLink2Description: Digi-Key Listing; ComponentLink2URL: https://www.digikey.com/product-detail/en/samsung-electro-mechanics/CL10B122KB8WPNC/1276-6602-2-ND/5961086; TemperatureCoefficient: X7R; Voltage: 50V; Price: 0; Device Package: 0603 (1608 Metric)
footprint CAP 0603/1608
pins: 1, 2

## CL10B123KB8NNNC
designator C?, comment 0.012uF
CAP CER 0.012UF 50V X7R 0603; Part Number: CL10B123KB8NNNC; Manufacturer: Samsung Electro-Mechanics America, Inc.; TemperatureRange: -55C ~ 125C; Tolerance: 10%; Value: 0.012uF; PartId: 5448; Supplier 1: Digi-Key; Supplier Part Number 1: 1276-1785-2-ND; ComponentLink1Description: Datasheet; ComponentLink1URL: http://www.samsungsem.com/kr/support/product-search/mlcc/CL10B123KB8NNNC.jsp; ComponentLink2Description: Digi-Key listing; ComponentLink2URL: http://digikey.com/product-detail/en/CL10B123KB8NNNC/1276-1785-2-ND/3887443; TemperatureCoefficient: X7R; Voltage: 50V; Price: 0.0153; Type: -; Device Package: 0603 (1608 Metric)
footprint CAP 0603/1608
pins: 1, 2

## CL10B151KB8NNNC
designator C?, comment 150pF
CAP CER 150PF 50V X7R 0603; Part Number: CL10B151KB8NNNC; Manufacturer: Samsung Electro-Mechanics; TemperatureRange: -55C ~ 125C; Tolerance: 10%; Value: 150pF; PartId: 30217; Supplier 1: Digi-Key; Supplier Part Number 1: 1276-1956-2-ND; ComponentLink1Description: Datasheet; ComponentLink1URL: http://www.samsungsem.com/kr/support/product-search/mlcc/CL10B151KB8NNNC.jsp; ComponentLink2Description: Digi-Key Listing; ComponentLink2URL: https://www.digikey.com/product-detail/en/samsung-electro-mechanics/CL10B151KB8NNNC/1276-1956-2-ND/3887614; TemperatureCoefficient: X7R; Voltage: 50V; Price: 0; Device Package: 0603 (1608 Metric)
footprint CAP 0603/1608
pins: 1, 2

## CL10B152JB8NNNC
designator C?, comment 1500pF
CAP CER 1500PF 50V X7R 0603; Part Number: CL10B152JB8NNNC; Manufacturer: Samsung Electro-Mechanics America, Inc.; TemperatureRange: -55C ~ 125C; Tolerance: 5%; Value: 1500pF; PartId: 5465; Supplier 1: Digi-Key; Supplier Part Number 1: 1276-1957-2-ND; ComponentLink1Description: Datasheet; ComponentLink1URL: http://www.samsungsem.com/kr/support/product-search/mlcc/CL10B152JB8NNNC.jsp; ComponentLink2Description: Digi-Key listing; ComponentLink2URL: http://digikey.com/product-detail/en/CL10B152JB8NNNC/1276-1957-2-ND/3887615; TemperatureCoefficient: X7R; Voltage: 50V; Price: 0.0163; Type: -; Device Package: 0603 (1608 Metric)
footprint CAP 0603/1608
pins: 1, 2

## CL10B152KB8NFNC
designator C?, comment 1500pF
CAP CER 1500PF 50V X7R 0603; Part Number: CL10B152KB8NFNC; Manufacturer: Samsung Electro-Mechanics; TemperatureRange: -55C ~ 125C; Tolerance: 10%; Value: 1500pF; PartId: 30214; Supplier 1: Digi-Key; Supplier Part Number 1: 1276-1958-2-ND; ComponentLink1Description: Datasheet; ComponentLink1URL: http://www.samsungsem.com/kr/support/product-search/mlcc/CL10B152KB8NFNC.jsp; ComponentLink2Description: Digi-Key Listing; ComponentLink2URL: https://www.digikey.com/product-detail/en/samsung-electro-mechanics/CL10B152KB8NFNC/1276-1958-2-ND/3887616; TemperatureCoefficient: X7R; Voltage: 50V; Price: 0; Device Package: 0603 (1608 Metric)
footprint CAP 0603/1608
pins: 1, 2

## CL10B152KB8SFNC
designator C?, comment 1500pF
CAP CER 1500PF 50V X7R 0603; Part Number: CL10B152KB8SFNC; Manufacturer: Samsung Electro-Mechanics America, Inc.; TemperatureRange: -55C ~ 125C; Tolerance: 10%; Value: 1500pF; PartId: 13179; Supplier 1: Digi-Key; Supplier Part Number 1: 1276-1960-2-ND; ComponentLink1Description: Datasheet; ComponentLink1URL: http://www.samsungsem.com/kr/support/product-search/mlcc/CL10B152KB8SFNC.jsp; ComponentLink2Description: Digi-Key Listing; ComponentLink2URL: https://www.digikey.com/product-detail/en/samsung-electro-mechanics-america-inc/CL10B152KB8SFNC/1276-1960-2-ND/3887618; TemperatureCoefficient: X7R; Voltage: 50V; Price: 0.0063; Device Package: 0603 (1608 Metric)
footprint CAP 0603/1608
pins: 1, 2

## CL10B152KC8WPNC
designator C?, comment 1500pF
CAP CER 1500PF 100V X7R 0603; Part Number: CL10B152KC8WPNC; Manufacturer: Samsung Electro-Mechanics; TemperatureRange: -55C ~ 125C; Tolerance: 10%; Value: 1500pF; PartId: 30370; Supplier 1: Digi-Key; Supplier Part Number 1: 1276-6681-2-ND; ComponentLink1Description: Datasheet; ComponentLink1URL: http://www.samsungsem.com/kr/support/product-search/mlcc/CL10B152KC8WPNC.jsp; ComponentLink2Description: Digi-Key Listing; ComponentLink2URL: https://www.digikey.com/product-detail/en/samsung-electro-mechanics/CL10B152KC8WPNC/1276-6681-2-ND/5961165; TemperatureCoefficient: X7R; Voltage: 100V; Price: 0; Device Package: 0603 (1608 Metric)
footprint CAP 0603/1608
pins: 1, 2

## CL10B153JB8NNNC
designator C?, comment 0.015uF